# Altium footprint library LukaLIBRARY.PcbLib: 772 footprints (part 1 of 49)
Each footprint in its own frame and in the unit in brackets; x right, y up, seen from the top. Pads: shape width x height; smd on the part's side, far side on the other; paste and mask are expansions set on the pad; w line width, h text height; cw(c..) or ccw(c..) is an arc to the next point about the centre after c.
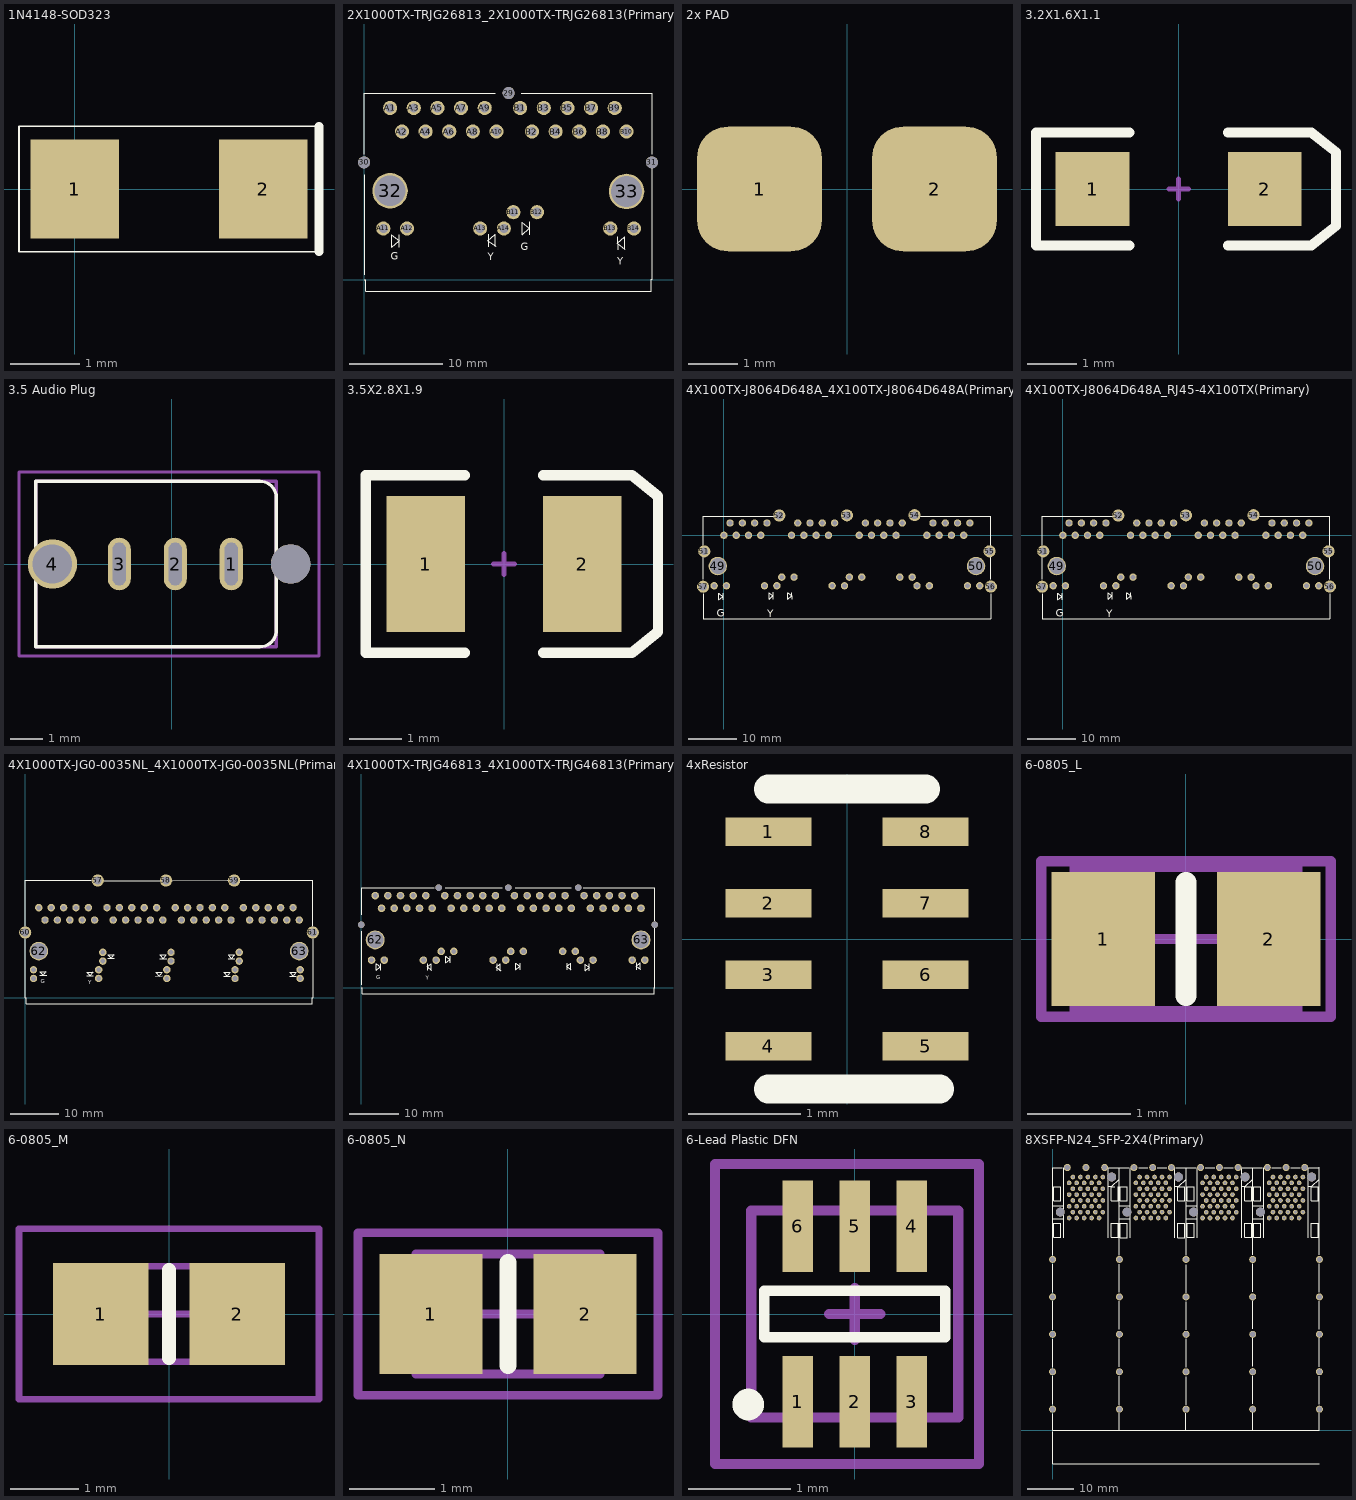
[diagram p0: the footprints below, top view; thin cyan lines are the x and y axes]

## 1N4148-SOD323 [mil]
pads (2):
  rect 50x56 smd mask-1000: 1(0,0) 2(106.3,0)
Top Overlay:
  lines w1: 137.8,-35.43 -31.5,-35.43 -31.5,35.43 137.8,35.43
  lines w4.92: 137.8,-35.43 137.8,35.43
Top Solder:
  region: -25,-28 25,-28 25,28 -25,28
  region: 81.3,-28 131.3,-28 131.3,28 81.3,28

## 2X1000TX-TRJG26813_2X1000TX-TRJG26813(Primary) [mil]
pads (33):
  round 51.18 on Top hole 51.18: 29(610.63,789.37) 30(-0.79,496.06) 31(1216.93,496.06)
  round 150 hole 130: 32(109.41,376.02) 33(1109.45,373.23)
  round 60 hole 38: A1(109.45,726.38) A2(159.45,626.38) A3(209.45,726.38) A4(259.45,626.38) A5(309.45,726.38) A6(359.45,626.38) A7(409.45,726.38) A8(459.45,626.38) A9(509.45,726.38) A10(559.45,626.38) A11(80.71,216.54) A12(181.1,216.54) A13(490.16,216.54) A14(590.55,216.54) B1(659.45,726.38) B2(709.45,626.38) B3(759.45,726.38) B4(809.45,626.38) B5(859.45,726.38) B6(909.45,626.38) B7(959.45,726.38) B8(1009.45,626.38) B9(1059.45,726.38) B10(1109.45,626.38) B11(630.71,285.43) B12(730.71,285.43) B13(1040.55,216.54) B14(1140.55,216.54)
Top Overlay:
  lines w0.04: 114.41,189.17 147.17,164.09 115.79,136.89 115.79,189.17 ; 145.79,190.59 146.5,136.89 ; 523.58,192.64 524.29,138.94 ; 554.29,140.35 554.29,192.64 522.91,165.43 555.67,140.35 ; 665.98,243.11 698.74,218.03 667.36,190.83 667.36,243.11 ; 697.36,244.53 698.07,190.83 ; 1070.83,180.83 1071.54,127.13 ; 1101.54,128.54 1101.54,180.83 1070.16,153.62 1102.91,128.54
  lines w3: -0.79,442.91 -0.39,20.87 ; -0.79,529.53 -0.79,787.4 ; -0.39,-0.79 6.3,-0.79 6.3,-48.03 1213.78,-48.03 1213.78,1.18 1217.72,1.18 ; -0.39,788.58 554.33,788.98 ; 664.17,789.37 1217.32,789.37 1217.32,529.53 ; 1217.72,1.97 1218.5,468.5
  text "Y" at 1070.08,62.99 h31.25
  text "Y" at 522.83,83.07 h31.25
  text "G" at 112.2,83.86 h31.25
  text "G" at 661.81,125.2 h31.25

## 2x PAD [mil]
pads (2):
  rrect50% 100x100 smd: 1(-70,0) 2(70,0)

## 3.2X1.6X1.1 [mm] "SMT LED; 2 Flat Leads"
height 1.2
pads (2):
  rect 1.5x1.5 smd: 1(-1.75,0) 2(1.75,0)
Top Overlay:
  lines w0.2: -1,-1.15 -2.9,-1.15 -2.9,1.15 -1,1.15 ; 1,-1.15 2.7,-1.15 3.2,-0.75 3.2,0.75 2.7,1.15 1,1.15
Mechanical 1:
  lines w0.1: -0.2,0 0.2,0 ; 0,-0.2 0,0.2

## 3.5 Audio Plug [mm]
pads (5):
  oval 0.7x1.6 hole 0.4 slot 1.3 at 90 deg: 1(1.816,0) 2(0.114,0) 3(-1.587,0)
  round 1.5 hole 1.2: 4(-3.619,0)
  round 1.2 hole 1.2: ""(3.619,0)
Top Overlay:
  lines w0.1: 3.188,2.007 3.188,-2.007 cw(c2.688,-2.015) 2.688,-2.515 -4.127,-2.515 -4.127,0 -4.127,2.515 2.68,2.515 cw(c2.688,2.015) 3.188,2.015
Mechanical 13:
  lines w0.1: -4.127,-2.515 3.188,-2.515 3.188,2.515 -4.127,2.515 -4.127,-2.515
Mechanical 15:
  lines w0.1: -4.635,-2.794 -4.635,2.794 4.483,2.794 4.483,-2.794 -4.635,-2.794

## 3.5X2.8X1.9 [mm] "SM LED; 2 C-Bend Leads; Body 3.5 x 2.8 x 1.9 mm, inc leads (LxWxH typ)"
height 1.9
pads (2):
  rect 1.5x2.6 smd: 1(-1.5,0) 2(1.5,0)
Top Overlay:
  lines w0.2: -0.75,-1.7 -2.65,-1.7 -2.65,1.7 -0.75,1.7 ; 0.75,-1.7 2.45,-1.7 2.95,-1.3 2.95,1.3 2.45,1.7 0.75,1.7
Mechanical 1:
  lines w0.1: -0.2,0 0.2,0 ; 0,-0.2 0,0.2

## 4X100TX-J8064D648A_4X100TX-J8064D648A(Primary) [mil]
pads (57):
  round 60 hole 38: 1a(0,0) 1b(550,0) 1c(1100,0) 1d(1650,0) 2a(50,100) 2b(600,100) 2c(1150,100) 2d(1700,100) 3a(100,0) 3b(650,0) 3c(1200,0) 3d(1750,0) 4a(150,100) 4b(700,100) 4c(1250,100) 4d(1800,100) 5a(200,0) 5b(750,0) 5c(1300,0) 5d(1850,0) 6a(250,100) 6b(800,100) 6c(1350,100) 6d(1900,100) 7a(300,0) 7b(850,0) 7c(1400,0) 7d(1950,0) 8a(350,100) 8b(900,100) 8c(1450,100) 8d(2000,100) 9a(-79.65,-410.35) 9b(470.35,-340.35) 9c(1020.35,-340.35) 9d(1570.35,-410.35) 10a(20.35,-410.35) 10b(570.35,-340.35) 10c(1120.35,-340.35) 10d(1670.35,-410.35) 11a(330.35,-410.35) 11b(880.35,-410.35) 11c(1430.35,-340.35) 11d(1980.35,-410.35) 12a(430.35,-410.35) 12b(980.35,-410.35) 12c(1530.35,-340.35) 12d(2080.35,-410.35)
  round 150 hole 130: 49(-49.65,-250.35) 50(2050.35,-250.35)
  round 98.43 hole 62.99 mask-1000: 51(-159.65,-130.35) 52(450.67,160.98) 53(1000.2,161.97) 54(1550.16,164.09) 55(2160.35,-130.35) 56(2170.98,-416.57) 57(-169.17,-418.15)
Top Layer:
  lines w0.04: 1913.94,155.63 2078.19,155.63
  lines w1.18: -214.17,-416.93 -148.03,-416.93
Top Overlay:
  lines w0.04: -41.5,-473.03 -8.74,-498.11 -40.12,-525.32 -40.12,-473.03 ; -10.12,-471.61 -9.41,-525.32 ; 365.35,-465.71 398.11,-490.79 366.73,-517.99 366.73,-465.71 ; 396.73,-464.29 397.44,-517.99 ; 518.03,-467.8 550.79,-492.87 519.41,-520.08 519.41,-467.8 ; 549.41,-466.38 550.12,-520.08
  lines w10: -169.69,-474.02 -169.65,-680.35 2170.35,-680.35 ; -169.69,-358.66 -169.65,-180.35 ; -169.65,-80.35 -169.41,155.39 ; -167.68,156.77 418.46,155.91 ; 1582.83,155.91 2168.98,155.04 ; 2170,-94.65 2170,155.35 ; 2170.12,-679.96 2170.08,-473.62 ; 2170.08,-358.27 2170.12,-179.96
  text "G" at -56.77,-663.58 h62.5
  text "Y" at 353.46,-667.05 h62.5
Top Solder:
  drawing of 7 lines, arcs and shapes, not listed
Bottom Solder:
  drawing of 7 lines, arcs and shapes, not listed

## 4X100TX-J8064D648A_RJ45-4X100TX(Primary) [mil]
pads (57):
  round 60 hole 38: 1a(0,0) 1b(550,0) 1c(1100,0) 1d(1650,0) 2a(50,100) 2b(600,100) 2c(1150,100) 2d(1700,100) 3a(100,0) 3b(650,0) 3c(1200,0) 3d(1750,0) 4a(150,100) 4b(700,100) 4c(1250,100) 4d(1800,100) 5a(200,0) 5b(750,0) 5c(1300,0) 5d(1850,0) 6a(250,100) 6b(800,100) 6c(1350,100) 6d(1900,100) 7a(300,0) 7b(850,0) 7c(1400,0) 7d(1950,0) 8a(350,100) 8b(900,100) 8c(1450,100) 8d(2000,100) 9a(-79.65,-410.35) 9b(470.35,-340.35) 9c(1020.35,-340.35) 9d(1570.35,-410.35) 10a(20.35,-410.35) 10b(570.35,-340.35) 10c(1120.35,-340.35) 10d(1670.35,-410.35) 11a(330.35,-410.35) 11b(880.35,-410.35) 11c(1430.35,-340.35) 11d(1980.35,-410.35) 12a(430.35,-410.35) 12b(980.35,-410.35) 12c(1530.35,-340.35) 12d(2080.35,-410.35)
  round 150 hole 130: 49(-49.65,-250.35) 50(2050.35,-250.35)
  round 98.43 hole 62.99 mask-1000: 51(-159.65,-130.35) 52(450.67,160.98) 53(1000.2,161.97) 54(1550.16,164.09) 55(2160.35,-130.35) 56(2170.98,-416.57) 57(-169.17,-418.15)
Top Layer:
  lines w0.04: 1913.94,155.63 2078.19,155.63
  lines w1.18: -214.17,-416.93 -148.03,-416.93
Top Overlay:
  lines w0.04: -41.5,-473.03 -8.74,-498.11 -40.12,-525.32 -40.12,-473.03 ; -10.12,-471.61 -9.41,-525.32 ; 365.35,-465.71 398.11,-490.79 366.73,-517.99 366.73,-465.71 ; 396.73,-464.29 397.44,-517.99 ; 518.03,-467.8 550.79,-492.87 519.41,-520.08 519.41,-467.8 ; 549.41,-466.38 550.12,-520.08
  lines w10: -169.69,-474.02 -169.65,-680.35 2170.35,-680.35 ; -169.69,-358.66 -169.65,-180.35 ; -169.65,-80.35 -169.41,155.39 ; -167.68,156.77 418.46,155.91 ; 1582.83,155.91 2168.98,155.04 ; 2170,-94.65 2170,155.35 ; 2170.12,-679.96 2170.08,-473.62 ; 2170.08,-358.27 2170.12,-179.96
  text "G" at -56.77,-663.58 h62.5
  text "Y" at 353.46,-667.05 h62.5
Top Solder:
  drawing of 7 lines, arcs and shapes, not listed
Bottom Solder:
  drawing of 7 lines, arcs and shapes, not listed

## 4X1000TX-JG0-0035NL_4X1000TX-JG0-0035NL(Primary) [mil]
pads (63):
  round 98.43 hole 62.99 mask-1000: 57(584.53,945.63) 58(1134.92,945.63) 59(1684.53,945.63) 60(-0.51,526.34) 61(2319.17,526.34)
  round 150 hole 130: 62(109.41,376.02) 63(2209.41,376.02)
  round 60 hole 38: A1(109.45,726.38) A2(159.45,626.38) A3(209.45,726.38) A4(259.45,626.38) A5(309.45,726.38) A6(359.45,626.38) A7(409.45,726.38) A8(459.45,626.38) A9(509.45,726.38) A10(559.45,626.38) A11(66.93,155.51) A12(66.93,225.59) A13(592.13,155.51) A14(592.13,225.59) B1(659.45,726.38) B2(709.45,626.38) B3(759.45,726.38) B4(809.45,626.38) B5(859.45,726.38) B6(909.45,626.38) B7(959.45,726.38) B8(1009.45,626.38) B9(1059.45,726.38) B10(1109.45,626.38) B11(625.59,295.67) B12(625.59,366.14) B13(1141.73,155.51) B14(1141.73,225.59) C1(1209.45,726.38) C2(1259.45,626.38) C3(1309.45,726.38) C4(1359.45,626.38) C5(1409.45,726.38) C6(1459.45,626.38) C7(1509.45,726.38) C8(1559.45,626.38) C9(1609.45,726.38) C10(1659.45,626.38) C11(1175.59,295.67) C12(1175.59,366.14) C13(1691.73,155.51) C14(1691.73,225.59) D1(1759.45,726.38) D2(1809.45,626.38) D3(1859.45,726.38) D4(1909.45,626.38) D5(1959.45,726.38) D6(2009.45,626.38) D7(2059.45,726.38) D8(2109.45,626.38) D9(2159.45,726.38) D10(2209.45,626.38) D11(1725.59,295.67) D12(1725.59,366.14) D13(2216.93,155.51) D14(2216.93,225.59)
Top Overlay:
  lines w0.04: 118.39,180.67 172.09,181.38 ; 170.67,211.38 118.39,211.38 145.59,180 170.67,212.76 ; 496.73,176.73 550.43,177.44 ; 549.02,207.44 496.73,207.44 523.94,176.06 549.02,208.82 ; 664.84,317.28 718.54,317.99 ; 717.13,347.99 664.84,347.99 692.05,316.61 717.13,349.37 ; 1053.03,175.16 1106.73,175.87 ; 1085.71,314.53 1139.41,315.24 ; 1105.32,205.87 1053.03,205.87 1080.24,174.49 1105.32,207.24 ; 1137.99,345.24 1085.71,345.24 1112.91,313.86 1137.99,346.61 ; 1601.46,173.19 1655.16,173.9 ; 1635.71,314.92 1689.41,315.63 ; 1653.74,203.9 1601.46,203.9 1628.66,172.52 1653.74,205.28 ; 1687.99,345.63 1635.71,345.63 1662.91,314.25 1687.99,347.01 ; 2132.17,174.37 2185.87,175.08 ; 2184.45,205.08 2132.17,205.08 2159.37,173.7 2184.45,206.46
  lines w3: -0.39,474.8 -0.39,-0.79 6.3,-0.79 6.3,-48.03 2314.17,-48.03 2314.17,-0.79 2319.29,-0.79 2318.9,474.41 ; -0.39,576.77 -0.39,946.06 533.46,946.06 ; 634.65,944.88 1083.46,945.28 ; 1186.61,945.28 1632.28,945.67 ; 1734.65,945.67 2319.29,945.67 2319.29,577.17
  text "G" at 126.77,116.54 h31.25
  text "Y" at 507.09,109.84 h31.25
Top Solder:
  region: 1134.92,995.27 1122.07,993.58 1110.1,988.62 1099.82,980.73 1091.93,970.45 1086.98,958.48 1085.28,945.63 1086.98,932.78 1091.93,920.81 1099.82,910.53 1110.1,902.64 1122.07,897.68 1134.92,895.99 1147.77,897.68 1159.74,902.64 1170.02,910.53 1177.91,920.81 1182.87,932.78 1184.56,945.63 1182.87,958.48 1177.91,970.45 1170.02,980.73 1159.74,988.62 1147.77,993.58
  region: 1684.53,995.27 1671.68,993.58 1659.71,988.62 1649.43,980.73 1641.54,970.45 1636.58,958.48 1634.89,945.63 1636.58,932.78 1641.54,920.81 1649.43,910.53 1659.71,902.64 1671.68,897.68 1684.53,895.99 1697.37,897.68 1709.35,902.64 1719.63,910.53 1727.51,920.81 1732.47,932.78 1734.16,945.63 1732.47,958.48 1727.51,970.45 1719.63,980.73 1709.35,988.62 1697.37,993.58
  region: 2319.17,575.98 2306.33,574.28 2294.35,569.33 2284.07,561.44 2276.19,551.16 2271.23,539.19 2269.54,526.34 2271.23,513.49 2276.19,501.52 2284.07,491.24 2294.35,483.35 2306.33,478.39 2319.17,476.7 2332.02,478.39 2343.99,483.35 2354.27,491.24 2362.16,501.52 2367.12,513.49 2368.81,526.34 2367.12,539.19 2362.16,551.16 2354.27,561.44 2343.99,569.33 2332.02,574.28
  region: -0.51,575.98 -13.36,574.28 -25.33,569.33 -35.61,561.44 -43.5,551.16 -48.46,539.19 -50.15,526.34 -48.46,513.49 -43.5,501.52 -35.61,491.24 -25.33,483.35 -13.36,478.39 -0.51,476.7 12.34,478.39 24.31,483.35 34.59,491.24 42.48,501.52 47.43,513.49 49.13,526.34 47.43,539.19 42.48,551.16 34.59,561.44 24.31,569.33 12.34,574.28
  region: 584.53,995.27 571.68,993.58 559.71,988.62 549.43,980.73 541.54,970.45 536.58,958.48 534.89,945.63 536.58,932.78 541.54,920.81 549.43,910.53 559.71,902.64 571.68,897.68 584.53,895.99 597.37,897.68 609.35,902.64 619.63,910.53 627.51,920.81 632.47,932.78 634.16,945.63 632.47,958.48 627.51,970.45 619.63,980.73 609.35,988.62 597.37,993.58
Bottom Solder:
  region: 1134.92,995.27 1122.07,993.58 1110.1,988.62 1099.82,980.73 1091.93,970.45 1086.98,958.48 1085.28,945.63 1086.98,932.78 1091.93,920.81 1099.82,910.53 1110.1,902.64 1122.07,897.68 1134.92,895.99 1147.77,897.68 1159.74,902.64 1170.02,910.53 1177.91,920.81 1182.87,932.78 1184.56,945.63 1182.87,958.48 1177.91,970.45 1170.02,980.73 1159.74,988.62 1147.77,993.58
  region: 1684.53,995.27 1671.68,993.58 1659.71,988.62 1649.43,980.73 1641.54,970.45 1636.58,958.48 1634.89,945.63 1636.58,932.78 1641.54,920.81 1649.43,910.53 1659.71,902.64 1671.68,897.68 1684.53,895.99 1697.37,897.68 1709.35,902.64 1719.63,910.53 1727.51,920.81 1732.47,932.78 1734.16,945.63 1732.47,958.48 1727.51,970.45 1719.63,980.73 1709.35,988.62 1697.37,993.58
  region: 2319.17,575.98 2306.33,574.28 2294.35,569.33 2284.07,561.44 2276.19,551.16 2271.23,539.19 2269.54,526.34 2271.23,513.49 2276.19,501.52 2284.07,491.24 2294.35,483.35 2306.33,478.39 2319.17,476.7 2332.02,478.39 2343.99,483.35 2354.27,491.24 2362.16,501.52 2367.12,513.49 2368.81,526.34 2367.12,539.19 2362.16,551.16 2354.27,561.44 2343.99,569.33 2332.02,574.28
  region: -0.51,575.98 -13.36,574.28 -25.33,569.33 -35.61,561.44 -43.5,551.16 -48.46,539.19 -50.15,526.34 -48.46,513.49 -43.5,501.52 -35.61,491.24 -25.33,483.35 -13.36,478.39 -0.51,476.7 12.34,478.39 24.31,483.35 34.59,491.24 42.48,501.52 47.43,513.49 49.13,526.34 47.43,539.19 42.48,551.16 34.59,561.44 24.31,569.33 12.34,574.28
  region: 584.53,995.27 571.68,993.58 559.71,988.62 549.43,980.73 541.54,970.45 536.58,958.48 534.89,945.63 536.58,932.78 541.54,920.81 549.43,910.53 559.71,902.64 571.68,897.68 584.53,895.99 597.37,897.68 609.35,902.64 619.63,910.53 627.51,920.81 632.47,932.78 634.16,945.63 632.47,958.48 627.51,970.45 619.63,980.73 609.35,988.62 597.37,993.58

## 4X1000TX-TRJG46813_4X1000TX-TRJG46813(Primary) [mil]
pads (63):
  round 51.18 on Top hole 51.18: 57(610.63,789.37) 58(1160.63,789.37) 59(1713.39,789.37) 60(-0.79,496.06) 61(2318.11,496.06)
  round 150 hole 130: 62(109.41,376.02) 63(2209.41,376.02)
  round 60 hole 38: A1(109.45,726.38) A2(159.45,626.38) A3(209.45,726.38) A4(259.45,626.38) A5(309.45,726.38) A6(359.45,626.38) A7(409.45,726.38) A8(459.45,626.38) A9(509.45,726.38) A10(559.45,626.38) A11(80.71,216.54) A12(181.1,216.54) A13(490.16,216.54) A14(590.55,216.54) B1(659.45,726.38) B2(709.45,626.38) B3(759.45,726.38) B4(809.45,626.38) B5(859.45,726.38) B6(909.45,626.38) B7(959.45,726.38) B8(1009.45,626.38) B9(1059.45,726.38) B10(1109.45,626.38) B11(630.71,285.43) B12(730.71,285.43) B13(1040.55,216.54) B14(1140.55,216.54) C1(1209.45,726.38) C2(1259.45,626.38) C3(1309.45,726.38) C4(1359.45,626.38) C5(1409.45,726.38) C6(1459.45,626.38) C7(1509.45,726.38) C8(1559.45,626.38) C9(1609.45,726.38) C10(1659.45,626.38) C11(1180.32,285.43) C12(1280.32,285.43) C13(1590.55,285.43) C14(1690.55,285.43) D1(1759.45,726.38) D2(1809.45,626.38) D3(1859.45,726.38) D4(1909.45,626.38) D5(1959.45,726.38) D6(2009.45,626.38) D7(2059.45,726.38) D8(2109.45,626.38) D9(2159.45,726.38) D10(2209.45,626.38) D11(1730.71,216.54) D12(1830.71,216.54) D13(2139.76,216.54) D14(2239.76,216.54)
Top Overlay:
  lines w0.04: 117.95,187.99 150.71,162.91 119.33,135.71 119.33,187.99 ; 149.33,189.41 150.04,135.71 ; 521.61,189.88 522.32,136.18 ; 552.32,137.6 552.32,189.88 520.94,162.68 553.7,137.6 ; 666.38,246.26 699.13,221.18 667.76,193.98 667.76,246.26 ; 697.76,247.68 698.46,193.98 ; 1068.07,186.34 1068.78,132.64 ; 1098.78,134.06 1098.78,186.34 1067.4,159.13 1100.16,134.06 ; 1220.32,191.54 1253.07,166.46 1221.69,139.25 1221.69,191.54 ; 1251.69,192.95 1252.4,139.25 ; 1622.01,193.82 1622.72,140.12 ; 1652.72,141.54 1652.72,193.82 1621.34,166.61 1654.09,141.54 ; 1766.38,185.63 1799.13,160.55 1767.76,133.35 1767.76,185.63 ; 1797.76,187.05 1798.46,133.35 ; 2171.22,195.39 2171.93,141.69 ; 2201.93,143.11 2201.93,195.39 2170.55,168.19 2203.31,143.11
  lines w3: -0.79,442.91 -0.39,20.87 ; -0.79,787.4 -0.39,576.77 ; -0.39,-0.79 6.3,-0.79 6.3,-48.03 2314.17,-48.03 2314.17,-0.79 2319.29,-0.79 ; -0.39,788.58 577.95,789.37 ; 664.17,789.37 1112.99,789.76 ; 1214.17,789.76 1659.84,790.16 ; 1752.36,789.37 2318.11,789.37 2318.11,529.53 ; 2318.11,0 2318.9,466.54
  text "G" at 117.32,65.35 h31.25
  text "Y" at 507.87,62.2 h31.25

## 4xResistor [mil]
pads (8):
  rect 30x10 smd: 1(-27.5,37.5) 2(-27.5,12.5) 3(-27.5,-12.5) 4(-27.5,-37.5) 5(27.5,-37.5) 6(27.5,-12.5) 7(27.5,12.5) 8(27.5,37.5)
Top Overlay:
  lines w10: -27.5,-52.5 32.5,-52.5 ; -27.5,52.5 27.5,52.5

## 6-0805_L [mm] "Chip Resistor, Body 2.0x1.2mm, IPC High Density"
height 0.7
pads (2):
  rect 1x1.3 smd: 1(-0.8,0) 2(0.8,0)
Top Overlay:
  lines w0.2: 0,-0.55 0,0.55
Mechanical 13:
  lines w0.1: -1.075,-0.7 1.075,-0.7 1.075,0.7 -1.075,0.7 -1.075,-0.7
Mechanical 15:
  lines w0.1: -0.5,0 0.5,0 ; 0,-0.5 0,0.5 ; -1.4,-0.75 1.4,-0.75 1.4,0.75 -1.4,0.75 -1.4,-0.75
3D body: height 0.7, standoff 0, extent -1.075,-0.7 1.075,0.7

## 6-0805_M [mm] "Chip Resistor, Body 2.0x1.2mm, IPC Low Density"
height 0.7
pads (2):
  rect 1.4x1.5 smd: 1(-1,0) 2(1,0)
Top Overlay:
  lines w0.2: 0,-0.65 0,0.65
Mechanical 13:
  lines w0.1: -1.075,-0.7 1.075,-0.7 1.075,0.7 -1.075,0.7 -1.075,-0.7
Mechanical 15:
  lines w0.1: -0.5,0 0.5,0 ; 0,-0.5 0,0.5 ; -2.2,-1.25 2.2,-1.25 2.2,1.25 -2.2,1.25 -2.2,-1.25
3D body: height 0.7, standoff 0, extent -1.075,-0.7 1.075,0.7

## 6-0805_N [mm] "Chip Resistor, Body 2.0x1.2mm, IPC Medium Density"
height 0.7
pads (2):
  rect 1.2x1.4 smd: 1(-0.9,0) 2(0.9,0)
Top Overlay:
  lines w0.2: 0,-0.6 0,0.6
Mechanical 13:
  lines w0.1: -1.075,-0.7 1.075,-0.7 1.075,0.7 -1.075,0.7 -1.075,-0.7
Mechanical 15:
  lines w0.1: -0.5,0 0.5,0 ; 0,-0.5 0,0.5 ; -1.75,-0.95 1.75,-0.95 1.75,0.95 -1.75,0.95 -1.75,-0.95
3D body: height 0.7, standoff 0, extent -1.075,-0.7 1.075,0.7

## 6-Lead Plastic DFN [mm] "2 x 2 x 0 .6mm"
pads (6):
  rect 0.3x0.9 smd: 1(-0.559,-0.864) 2(0,-0.864) 3(0.559,-0.864) 4(0.559,0.864) 5(0,0.864) 6(-0.559,0.864)
Top Overlay:
  circle w0.25: c-1.046,-0.889 r0.03
  lines w0.1: -0.889,-0.229 0.889,-0.229 0.889,0.229 -0.889,0.229 -0.889,-0.229
Mechanical 13:
  lines w0.1: -1.016,-1.016 1.016,-1.016 1.016,1.016 -1.016,1.016 -1.016,-1.016
Mechanical 15:
  lines w0.1: -0.254,0 0.254,0 ; 0,-0.254 0,0.254 ; -1.372,-1.473 -1.372,1.473 1.219,1.473 1.219,-1.473 -1.372,-1.473

## 8XSFP-N24_SFP-2X4(Primary) [mm]
pads (205):
  round 1.5 hole 1.1: 161(3.13,56.14) 162(7.13,56.14) 163(11.12,56.14) 164(17.38,56.13) 165(21.38,56.13) 166(25.37,56.13) 167(31.63,56.14) 168(35.63,56.14) 169(39.62,56.14) 170(45.88,56.14) 171(49.88,56.14) 172(53.87,56.14) 181(0,36.5) 182(14.26,36.5) 183(28.5,36.5) 184(42.75,36.5) 185(57,36.5) 186(0,28.5) 187(14.26,28.5) 188(28.5,28.5) 189(42.75,28.5) 190(57,28.5) 191(0,20.5) 192(14.26,20.5) 193(28.52,20.5) 194(42.76,20.5) 195(57,20.5) 196(0,12.5) 197(14.26,12.5) 198(28.51,12.49) 199(42.75,12.51) 200(57,12.51) 201(0,4.5) 202(14.26,4.5) 203(28.51,4.5) 204(42.75,4.5) 205(57,4.5)
  round 1.9 hole 1.9: 173(12.63,54.12) 174(26.88,54.11) 175(41.13,54.12) 176(55.38,54.12) 177(1.63,46.62) 178(15.88,46.61) 179(30.13,46.62) 180(44.38,46.62)
  round 1 hole 0.62: L1A(10.73,49.1) L1B(24.98,49.1) L1C(39.23,49.1) L1D(53.48,49.1) L2A(9.93,47.85) L2B(24.18,47.85) L2C(38.43,47.85) L2D(52.68,47.85) L3A(9.13,49.1) L3B(23.38,49.1) L3C(37.63,49.1) L3D(51.88,49.1) L4A(8.33,47.85) L4B(22.58,47.85) L4C(36.83,47.85) L4D(51.08,47.85) L5A(7.53,49.1) L5B(21.78,49.1) L5C(36.03,49.1) L5D(50.28,49.1) L6A(6.73,47.85) L6B(20.98,47.85) L6C(35.23,47.85) L6D(49.48,47.85) L7A(5.93,49.1) L7B(20.18,49.1) L7C(34.43,49.1) L7D(48.68,49.1) L8A(5.13,47.85) L8B(19.38,47.85) L8C(33.63,47.85) L8D(47.88,47.85) L9A(4.33,49.1) L9B(18.58,49.1) L9C(32.83,49.1) L9D(47.08,49.1) L10A(3.53,47.85) L10B(17.78,47.85) L10C(32.03,47.85) L10D(46.28,47.85) L11A(3.53,45.35) L11B(17.78,45.35) L11C(32.03,45.35) L11D(46.28,45.35) L12A(4.33,46.6) L12B(18.58,46.6) L12C(32.83,46.6) L12D(47.08,46.6) L13A(5.13,45.35) L13B(19.38,45.35) L13C(33.63,45.35) L13D(47.88,45.35) L14A(5.93,46.6) L14B(20.18,46.6) L14C(34.43,46.6) L14D(48.68,46.6) L15A(6.73,45.35) L15B(20.98,45.35) L15C(35.23,45.35) L15D(49.48,45.35) L16A(7.53,46.6) L16B(21.78,46.6) L16C(36.03,46.6) L16D(50.28,46.6) L17A(8.33,45.35) L17B(22.58,45.35) L17C(36.83,45.35) L17D(51.08,45.35) L18A(9.13,46.6) L18B(23.38,46.6) L18C(37.63,46.6) L18D(51.88,46.6) L19A(9.93,45.35) L19B(24.18,45.35) L19C(38.43,45.35) L19D(52.68,45.35) L20A(10.73,46.6) L20B(24.98,46.6) L20C(39.23,46.6) L20D(53.48,46.6) T1A(3.53,50.35) T1B(17.78,50.35) T1C(32.03,50.35) T1D(46.28,50.35) T2A(4.33,51.6) T2B(18.58,51.6) T2C(32.83,51.6) T2D(47.08,51.6) T3A(5.13,50.35) T3B(19.38,50.35) T3C(33.63,50.35) T3D(47.88,50.35) T4A(5.93,51.6) T4B(20.18,51.6) T4C(34.43,51.6) T4D(48.68,51.6) T5A(6.73,50.35) T5B(20.98,50.35) T5C(35.23,50.35) T5D(49.48,50.35) T6A(7.53,51.6) T6B(21.78,51.6) T6C(36.03,51.6) T6D(50.28,51.6) T7A(8.33,50.35) T7B(22.58,50.35) T7C(36.83,50.35) T7D(51.08,50.35) T8A(9.13,51.6) T8B(23.38,51.6) T8C(37.63,51.6) T8D(51.88,51.6) T9A(9.93,50.35) T9B(24.18,50.35) T9C(38.43,50.35) T9D(52.68,50.35) T10A(10.73,51.6) T10B(24.98,51.6) T10C(39.23,51.6) T10D(53.48,51.6) T11A(10.73,54.1) T11B(24.98,54.1) T11C(39.23,54.1) T11D(53.48,54.1) T12A(9.93,52.85) T12B(24.18,52.85) T12C(38.43,52.85) T12D(52.68,52.85) T13A(9.13,54.1) T13B(23.38,54.1) T13C(37.63,54.1) T13D(51.88,54.1) T14A(8.33,52.85) T14B(22.58,52.85) T14C(36.83,52.85) T14D(51.08,52.85) T15A(7.53,54.1) T15B(21.78,54.1) T15C(36.03,54.1) T15D(50.28,54.1) T16A(6.73,52.85) T16B(20.98,52.85) T16C(35.23,52.85) T16D(49.48,52.85) T17A(5.93,54.1) T17B(20.18,54.1) T17C(34.43,54.1) T17D(48.68,54.1) T18A(5.13,52.85) T18B(19.38,52.85) T18C(33.63,52.85) T18D(47.88,52.85) T19A(4.33,54.1) T19B(18.58,54.1) T19C(32.83,54.1) T19D(47.08,54.1) T20A(3.53,52.85) T20B(17.78,52.85) T20C(32.03,52.85) T20D(46.28,52.85)
Top Overlay:
  drawing of 166 lines, arcs and shapes, not listed
Bottom Overlay:
  text "L2" at 12.64,46.49 h0.79
  text "L19" at 13.49,43.65 h0.79
  text "L20" at 13.47,42.24 h0.79
  text "L1" at 12.64,45.15 h0.79
  text "T2" at 46.34,48.13 h0.79
  text "T2" at 32.09,48.13 h0.79
  text "T2" at 17.84,48.12 h0.79
  text "T2" at 3.59,48.13 h0.79
  text "L2" at 55.39,46.49 h0.79
  text "L19" at 56.24,43.65 h0.79
  text "L20" at 56.22,42.24 h0.79
  text "L1" at 55.39,45.15 h0.79
  text "T1" at 45.59,49.48 h0.79
  text "T20" at 45.58,52.42 h0.79
  text "T19" at 46.34,51.03 h0.79
  text "L19" at 41.99,43.65 h0.79
  text "L20" at 41.97,42.24 h0.79
  text "L2" at 41.14,46.49 h0.79
  text "L1" at 41.14,45.15 h0.79
  text "T1" at 31.34,49.48 h0.79
  text "T20" at 31.33,52.42 h0.79
  text "T19" at 32.09,51.03 h0.79
  text "L2" at 26.89,46.48 h0.79
  text "L19" at 27.74,43.64 h0.79
  text "L20" at 27.72,42.23 h0.79
  text "L1" at 26.89,45.14 h0.79
  text "T1" at 17.09,49.47 h0.79
  text "T20" at 17.08,52.41 h0.79
  text "T19" at 17.84,51.02 h0.79
  text "T1" at 2.84,49.48 h0.79
  text "T20" at 2.83,52.42 h0.79
  text "T19" at 3.59,51.03 h0.79
Top Solder:
  drawing of 160 lines, arcs and shapes, not listed